# Altium footprint library IC.PcbLib: 386 footprints (part 8 of 30)
Each footprint in its own frame and in the unit in brackets; x right, y up, seen from the top. Pads: shape width x height; smd on the part's side, far side on the other; paste and mask are expansions set on the pad; w line width, h text height; cw(c..) or ccw(c..) is an arc to the next point about the centre after c.
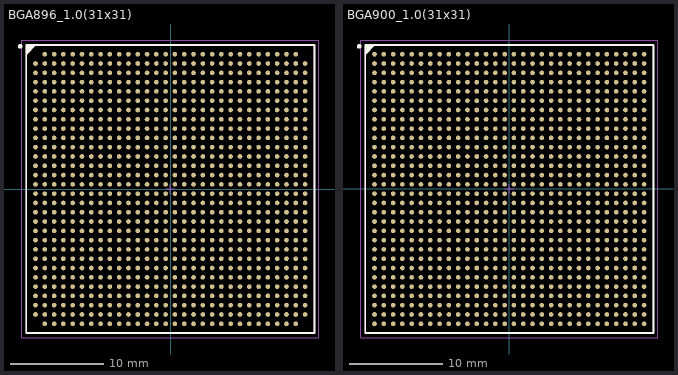
[diagram p7: the footprints below, top view; thin cyan lines are the x and y axes]

## BGA896_1.0(31x31) [mm]
height 0.65
pads (896):
  round 0.5 smd: A2(-13.525,14.525) A3(-12.525,14.525) A4(-11.525,14.525) A5(-10.525,14.525) A6(-9.525,14.525) A7(-8.525,14.525) A8(-7.525,14.525) A9(-6.525,14.525) A10(-5.525,14.525) A11(-4.525,14.525) A12(-3.525,14.525) A13(-2.525,14.525) A14(-1.525,14.525) A15(-0.525,14.525) A16(0.475,14.525) A17(1.475,14.525) A18(2.475,14.525) A19(3.475,14.525) A20(4.475,14.525) A21(5.475,14.525) A22(6.475,14.525) A23(7.475,14.525) A24(8.475,14.525) A25(9.475,14.525) A26(10.475,14.525) A27(11.475,14.525) A28(12.475,14.525) A29(13.475,14.525) AA1(-14.525,-5.475) AA2(-13.525,-5.475) AA3(-12.525,-5.475) AA4(-11.525,-5.475) AA5(-10.525,-5.475) AA6(-9.525,-5.475) AA7(-8.525,-5.475) AA8(-7.525,-5.475) AA9(-6.525,-5.475) AA10(-5.525,-5.475) AA11(-4.525,-5.475) AA12(-3.525,-5.475) AA13(-2.525,-5.475) AA14(-1.525,-5.475) AA15(-0.525,-5.475) AA16(0.475,-5.475) AA17(1.475,-5.475) AA18(2.475,-5.475) AA19(3.475,-5.475) AA20(4.475,-5.475) AA21(5.475,-5.475) AA22(6.475,-5.475) AA23(7.475,-5.475) AA24(8.475,-5.475) AA25(9.475,-5.475) AA26(10.475,-5.475) AA27(11.475,-5.475) AA28(12.475,-5.475) AA29(13.475,-5.475) AA30(14.475,-5.475) AB1(-14.525,-6.475) AB2(-13.525,-6.475) AB3(-12.525,-6.475) AB4(-11.525,-6.475) AB5(-10.525,-6.475) AB6(-9.525,-6.475) AB7(-8.525,-6.475) AB8(-7.525,-6.475) AB9(-6.525,-6.475) AB10(-5.525,-6.475) AB11(-4.525,-6.475) AB12(-3.525,-6.475) AB13(-2.525,-6.475) AB14(-1.525,-6.475) AB15(-0.525,-6.475) AB16(0.475,-6.475) AB17(1.475,-6.475) AB18(2.475,-6.475) AB19(3.475,-6.475) AB20(4.475,-6.475) AB21(5.475,-6.475) AB22(6.475,-6.475) AB23(7.475,-6.475) AB24(8.475,-6.475) AB25(9.475,-6.475) AB26(10.475,-6.475) AB27(11.475,-6.475) AB28(12.475,-6.475) AB29(13.475,-6.475) AB30(14.475,-6.475) AC1(-14.525,-7.475) AC2(-13.525,-7.475) AC3(-12.525,-7.475) AC4(-11.525,-7.475) AC5(-10.525,-7.475) AC6(-9.525,-7.475) AC7(-8.525,-7.475) AC8(-7.525,-7.475) AC9(-6.525,-7.475) AC10(-5.525,-7.475) AC11(-4.525,-7.475) AC12(-3.525,-7.475) AC13(-2.525,-7.475) AC14(-1.525,-7.475) AC15(-0.525,-7.475) AC16(0.475,-7.475) AC17(1.475,-7.475) AC18(2.475,-7.475) AC19(3.475,-7.475) AC20(4.475,-7.475) AC21(5.475,-7.475) AC22(6.475,-7.475) AC23(7.475,-7.475) AC24(8.475,-7.475) AC25(9.475,-7.475) AC26(10.475,-7.475) AC27(11.475,-7.475) AC28(12.475,-7.475) AC29(13.475,-7.475) AC30(14.475,-7.475) AD1(-14.525,-8.475) AD2(-13.525,-8.475) AD3(-12.525,-8.475) AD4(-11.525,-8.475) AD5(-10.525,-8.475) AD6(-9.525,-8.475) AD7(-8.525,-8.475) AD8(-7.525,-8.475) AD9(-6.525,-8.475) AD10(-5.525,-8.475) AD11(-4.525,-8.475) AD12(-3.525,-8.475) AD13(-2.525,-8.475) AD14(-1.525,-8.475) AD15(-0.525,-8.475) AD16(0.475,-8.475) AD17(1.475,-8.475) AD18(2.475,-8.475) AD19(3.475,-8.475) AD20(4.475,-8.475) AD21(5.475,-8.475) AD22(6.475,-8.475) AD23(7.475,-8.475) AD24(8.475,-8.475) AD25(9.475,-8.475) AD26(10.475,-8.475) AD27(11.475,-8.475) AD28(12.475,-8.475) AD29(13.475,-8.475) AD30(14.475,-8.475) AE1(-14.525,-9.475) AE2(-13.525,-9.475) AE3(-12.525,-9.475) AE4(-11.525,-9.475) AE5(-10.525,-9.475) AE6(-9.525,-9.475) AE7(-8.525,-9.475) AE8(-7.525,-9.475) AE9(-6.525,-9.475) AE10(-5.525,-9.475) AE11(-4.525,-9.475) AE12(-3.525,-9.475) AE13(-2.525,-9.475) AE14(-1.525,-9.475) AE15(-0.525,-9.475) AE16(0.475,-9.475) AE17(1.475,-9.475) AE18(2.475,-9.475) AE19(3.475,-9.475) AE20(4.475,-9.475) AE21(5.475,-9.475) AE22(6.475,-9.475) AE23(7.475,-9.475) AE24(8.475,-9.475) AE25(9.475,-9.475) AE26(10.475,-9.475) AE27(11.475,-9.475) AE28(12.475,-9.475) AE29(13.475,-9.475) AE30(14.475,-9.475) AF1(-14.525,-10.475) AF2(-13.525,-10.475) AF3(-12.525,-10.475) AF4(-11.525,-10.475) AF5(-10.525,-10.475) AF6(-9.525,-10.475) AF7(-8.525,-10.475) AF8(-7.525,-10.475) AF9(-6.525,-10.475) AF10(-5.525,-10.475) AF11(-4.525,-10.475) AF12(-3.525,-10.475) AF13(-2.525,-10.475) AF14(-1.525,-10.475) AF15(-0.525,-10.475) AF16(0.475,-10.475) AF17(1.475,-10.475) AF18(2.475,-10.475) AF19(3.475,-10.475) AF20(4.475,-10.475) AF21(5.475,-10.475) AF22(6.475,-10.475) AF23(7.475,-10.475) AF24(8.475,-10.475) AF25(9.475,-10.475) AF26(10.475,-10.475) AF27(11.475,-10.475) AF28(12.475,-10.475) AF29(13.475,-10.475) AF30(14.475,-10.475) AG1(-14.525,-11.475) AG2(-13.525,-11.475) AG3(-12.525,-11.475) AG4(-11.525,-11.475) AG5(-10.525,-11.475) AG6(-9.525,-11.475) AG7(-8.525,-11.475) AG8(-7.525,-11.475) AG9(-6.525,-11.475) AG10(-5.525,-11.475) AG11(-4.525,-11.475) AG12(-3.525,-11.475) AG13(-2.525,-11.475) AG14(-1.525,-11.475) AG15(-0.525,-11.475) AG16(0.475,-11.475) AG17(1.475,-11.475) AG18(2.475,-11.475) AG19(3.475,-11.475) AG20(4.475,-11.475) AG21(5.475,-11.475) AG22(6.475,-11.475) AG23(7.475,-11.475) AG24(8.475,-11.475) AG25(9.475,-11.475) AG26(10.475,-11.475) AG27(11.475,-11.475) AG28(12.475,-11.475) AG29(13.475,-11.475) AG30(14.475,-11.475) AH1(-14.525,-12.475) AH2(-13.525,-12.475) AH3(-12.525,-12.475) AH4(-11.525,-12.475) AH5(-10.525,-12.475) AH6(-9.525,-12.475) AH7(-8.525,-12.475) AH8(-7.525,-12.475) AH9(-6.525,-12.475) AH10(-5.525,-12.475) AH11(-4.525,-12.475) AH12(-3.525,-12.475) AH13(-2.525,-12.475) AH14(-1.525,-12.475) AH15(-0.525,-12.475) AH16(0.475,-12.475) AH17(1.475,-12.475) AH18(2.475,-12.475) AH19(3.475,-12.475) AH20(4.475,-12.475) AH21(5.475,-12.475) AH22(6.475,-12.475) AH23(7.475,-12.475) AH24(8.475,-12.475) AH25(9.475,-12.475) AH26(10.475,-12.475) AH27(11.475,-12.475) AH28(12.475,-12.475) AH29(13.475,-12.475) AH30(14.475,-12.475) AJ1(-14.525,-13.475) AJ2(-13.525,-13.475) AJ3(-12.525,-13.475) AJ4(-11.525,-13.475) AJ5(-10.525,-13.475) AJ6(-9.525,-13.475) AJ7(-8.525,-13.475) AJ8(-7.525,-13.475) AJ9(-6.525,-13.475) AJ10(-5.525,-13.475) AJ11(-4.525,-13.475) AJ12(-3.525,-13.475) AJ13(-2.525,-13.475) AJ14(-1.525,-13.475) AJ15(-0.525,-13.475) AJ16(0.475,-13.475) AJ17(1.475,-13.475) AJ18(2.475,-13.475) AJ19(3.475,-13.475) AJ20(4.475,-13.475) AJ21(5.475,-13.475) AJ22(6.475,-13.475) AJ23(7.475,-13.475) AJ24(8.475,-13.475) AJ25(9.475,-13.475) AJ26(10.475,-13.475) AJ27(11.475,-13.475) AJ28(12.475,-13.475) AJ29(13.475,-13.475) AJ30(14.475,-13.475) AK2(-13.525,-14.475) AK3(-12.525,-14.475) AK4(-11.525,-14.475) AK5(-10.525,-14.475) AK6(-9.525,-14.475) AK7(-8.525,-14.475) AK8(-7.525,-14.475) AK9(-6.525,-14.475) AK10(-5.525,-14.475) AK11(-4.525,-14.475) AK12(-3.525,-14.475) AK13(-2.525,-14.475) AK14(-1.525,-14.475) AK15(-0.525,-14.475) AK16(0.475,-14.475) AK17(1.475,-14.475) AK18(2.475,-14.475) AK19(3.475,-14.475) AK20(4.475,-14.475) AK21(5.475,-14.475) AK22(6.475,-14.475) AK23(7.475,-14.475) AK24(8.475,-14.475) AK25(9.475,-14.475) AK26(10.475,-14.475) AK27(11.475,-14.475) AK28(12.475,-14.475) AK29(13.475,-14.475) B1(-14.525,13.525) B2(-13.525,13.525) B3(-12.525,13.525) B4(-11.525,13.525) B5(-10.525,13.525) B6(-9.525,13.525) B7(-8.525,13.525) B8(-7.525,13.525) B9(-6.525,13.525) B10(-5.525,13.525) B11(-4.525,13.525) B12(-3.525,13.525) B13(-2.525,13.525) B14(-1.525,13.525) B15(-0.525,13.525) B16(0.475,13.525) B17(1.475,13.525) B18(2.475,13.525) B19(3.475,13.525) B20(4.475,13.525) B21(5.475,13.525) B22(6.475,13.525) B23(7.475,13.525) B24(8.475,13.525) B25(9.475,13.525) B26(10.475,13.525) B27(11.475,13.525) B28(12.475,13.525) B29(13.475,13.525) B30(14.475,13.525) C1(-14.525,12.525) C2(-13.525,12.525) C3(-12.525,12.525) C4(-11.525,12.525) C5(-10.525,12.525) C6(-9.525,12.525) C7(-8.525,12.525) C8(-7.525,12.525) C9(-6.525,12.525) C10(-5.525,12.525) C11(-4.525,12.525) C12(-3.525,12.525) C13(-2.525,12.525) C14(-1.525,12.525) C15(-0.525,12.525) C16(0.475,12.525) C17(1.475,12.525) C18(2.475,12.525) C19(3.475,12.525) C20(4.475,12.525) C21(5.475,12.525) C22(6.475,12.525) C23(7.475,12.525) C24(8.475,12.525) C25(9.475,12.525) C26(10.475,12.525) C27(11.475,12.525) C28(12.475,12.525) C29(13.475,12.525) C30(14.475,12.525) D1(-14.525,11.525) D2(-13.525,11.525) D3(-12.525,11.525) D4(-11.525,11.525) D5(-10.525,11.525) D6(-9.525,11.525) D7(-8.525,11.525) D8(-7.525,11.525) D9(-6.525,11.525) D10(-5.525,11.525) D11(-4.525,11.525) D12(-3.525,11.525) D13(-2.525,11.525) D14(-1.525,11.525) D15(-0.525,11.525) D16(0.475,11.525) D17(1.475,11.525) D18(2.475,11.525) D19(3.475,11.525) D20(4.475,11.525) D21(5.475,11.525) D22(6.475,11.525) D23(7.475,11.525) D24(8.475,11.525) D25(9.475,11.525) D26(10.475,11.525) D27(11.475,11.525) D28(12.475,11.525) D29(13.475,11.525) D30(14.475,11.525) E1(-14.525,10.525) E2(-13.525,10.525) E3(-12.525,10.525) E4(-11.525,10.525) E5(-10.525,10.525) E6(-9.525,10.525) E7(-8.525,10.525) E8(-7.525,10.525) E9(-6.525,10.525) E10(-5.525,10.525) E11(-4.525,10.525) E12(-3.525,10.525) E13(-2.525,10.525) E14(-1.525,10.525) E15(-0.525,10.525) E16(0.475,10.525) E17(1.475,10.525) E18(2.475,10.525) E19(3.475,10.525) E20(4.475,10.525) E21(5.475,10.525) E22(6.475,10.525) E23(7.475,10.525) E24(8.475,10.525) E25(9.475,10.525) E26(10.475,10.525) E27(11.475,10.525) E28(12.475,10.525) E29(13.475,10.525) E30(14.475,10.525) F1(-14.525,9.525) F2(-13.525,9.525) F3(-12.525,9.525) F4(-11.525,9.525) F5(-10.525,9.525) F6(-9.525,9.525) F7(-8.525,9.525) F8(-7.525,9.525) F9(-6.525,9.525) F10(-5.525,9.525) F11(-4.525,9.525) F12(-3.525,9.525) F13(-2.525,9.525) F14(-1.525,9.525) F15(-0.525,9.525) F16(0.475,9.525) F17(1.475,9.525) F18(2.475,9.525) F19(3.475,9.525) F20(4.475,9.525) F21(5.475,9.525) F22(6.475,9.525) F23(7.475,9.525) F24(8.475,9.525) F25(9.475,9.525) F26(10.475,9.525) F27(11.475,9.525) F28(12.475,9.525) F29(13.475,9.525) F30(14.475,9.525) G1(-14.525,8.525) G2(-13.525,8.525) G3(-12.525,8.525) G4(-11.525,8.525) G5(-10.525,8.525) G6(-9.525,8.525) G7(-8.525,8.525) G8(-7.525,8.525) G9(-6.525,8.525) G10(-5.525,8.525) G11(-4.525,8.525) G12(-3.525,8.525) G13(-2.525,8.525) G14(-1.525,8.525) G15(-0.525,8.525) G16(0.475,8.525) G17(1.475,8.525) G18(2.475,8.525) G19(3.475,8.525) G20(4.475,8.525) G21(5.475,8.525) G22(6.475,8.525) G23(7.475,8.525) G24(8.475,8.525) G25(9.475,8.525) G26(10.475,8.525) G27(11.475,8.525) G28(12.475,8.525) G29(13.475,8.525) G30(14.475,8.525) H1(-14.525,7.525) H2(-13.525,7.525) H3(-12.525,7.525) H4(-11.525,7.525) H5(-10.525,7.525) H6(-9.525,7.525) H7(-8.525,7.525) H8(-7.525,7.525) H9(-6.525,7.525) H10(-5.525,7.525) H11(-4.525,7.525) H12(-3.525,7.525) H13(-2.525,7.525) H14(-1.525,7.525) H15(-0.525,7.525) H16(0.475,7.525) H17(1.475,7.525) H18(2.475,7.525) H19(3.475,7.525) H20(4.475,7.525) H21(5.475,7.525) H22(6.475,7.525) H23(7.475,7.525) H24(8.475,7.525) H25(9.475,7.525) H26(10.475,7.525) H27(11.475,7.525) H28(12.475,7.525) H29(13.475,7.525) H30(14.475,7.525) J1(-14.525,6.525) J2(-13.525,6.525) J3(-12.525,6.525) J4(-11.525,6.525) J5(-10.525,6.525) J6(-9.525,6.525) J7(-8.525,6.525) J8(-7.525,6.525) J9(-6.525,6.525) J10(-5.525,6.525) J11(-4.525,6.525) J12(-3.525,6.525) J13(-2.525,6.525) J14(-1.525,6.525) J15(-0.525,6.525) J16(0.475,6.525) J17(1.475,6.525) J18(2.475,6.525) J19(3.475,6.525) J20(4.475,6.525) J21(5.475,6.525) J22(6.475,6.525) J23(7.475,6.525) J24(8.475,6.525) J25(9.475,6.525) J26(10.475,6.525) J27(11.475,6.525) J28(12.475,6.525) J29(13.475,6.525) J30(14.475,6.525) K1(-14.525,5.525) K2(-13.525,5.525) K3(-12.525,5.525) K4(-11.525,5.525) K5(-10.525,5.525) K6(-9.525,5.525) K7(-8.525,5.525) K8(-7.525,5.525) K9(-6.525,5.525) K10(-5.525,5.525) K11(-4.525,5.525) K12(-3.525,5.525) K13(-2.525,5.525) K14(-1.525,5.525) K15(-0.525,5.525) K16(0.475,5.525) K17(1.475,5.525) K18(2.475,5.525) K19(3.475,5.525) K20(4.475,5.525) K21(5.475,5.525) K22(6.475,5.525) K23(7.475,5.525) K24(8.475,5.525) K25(9.475,5.525) K26(10.475,5.525) K27(11.475,5.525) K28(12.475,5.525) K29(13.475,5.525) K30(14.475,5.525) L1(-14.525,4.525) L2(-13.525,4.525) L3(-12.525,4.525) L4(-11.525,4.525) L5(-10.525,4.525) L6(-9.525,4.525) L7(-8.525,4.525) L8(-7.525,4.525) L9(-6.525,4.525) L10(-5.525,4.525) L11(-4.525,4.525) L12(-3.525,4.525) L13(-2.525,4.525) L14(-1.525,4.525) L15(-0.525,4.525) L16(0.475,4.525) L17(1.475,4.525) L18(2.475,4.525) L19(3.475,4.525) L20(4.475,4.525) L21(5.475,4.525) L22(6.475,4.525) L23(7.475,4.525) L24(8.475,4.525) L25(9.475,4.525) L26(10.475,4.525) L27(11.475,4.525) L28(12.475,4.525) L29(13.475,4.525) L30(14.475,4.525) M1(-14.525,3.525) M2(-13.525,3.525) M3(-12.525,3.525) M4(-11.525,3.525) M5(-10.525,3.525) M6(-9.525,3.525) M7(-8.525,3.525) M8(-7.525,3.525) M9(-6.525,3.525) M10(-5.525,3.525) M11(-4.525,3.525) M12(-3.525,3.525) M13(-2.525,3.525) M14(-1.525,3.525) M15(-0.525,3.525) M16(0.475,3.525) M17(1.475,3.525) M18(2.475,3.525) M19(3.475,3.525) M20(4.475,3.525) M21(5.475,3.525) M22(6.475,3.525) M23(7.475,3.525) M24(8.475,3.525) M25(9.475,3.525) M26(10.475,3.525) M27(11.475,3.525) M28(12.475,3.525) M29(13.475,3.525) M30(14.475,3.525) N1(-14.525,2.525) N2(-13.525,2.525) N3(-12.525,2.525) N4(-11.525,2.525) N5(-10.525,2.525) N6(-9.525,2.525) N7(-8.525,2.525) N8(-7.525,2.525) N9(-6.525,2.525) N10(-5.525,2.525) N11(-4.525,2.525) N12(-3.525,2.525) N13(-2.525,2.525) N14(-1.525,2.525) N15(-0.525,2.525) N16(0.475,2.525) N17(1.475,2.525) N18(2.475,2.525) N19(3.475,2.525) N20(4.475,2.525) N21(5.475,2.525) N22(6.475,2.525) N23(7.475,2.525) N24(8.475,2.525) N25(9.475,2.525) N26(10.475,2.525) N27(11.475,2.525) N28(12.475,2.525) N29(13.475,2.525) N30(14.475,2.525) P1(-14.525,1.525) P2(-13.525,1.525) P3(-12.525,1.525) P4(-11.525,1.525) P5(-10.525,1.525) P6(-9.525,1.525) P7(-8.525,1.525) P8(-7.525,1.525) P9(-6.525,1.525) P10(-5.525,1.525) P11(-4.525,1.525) P12(-3.525,1.525) P13(-2.525,1.525) P14(-1.525,1.525) P15(-0.525,1.525) P16(0.475,1.525) P17(1.475,1.525) P18(2.475,1.525) P19(3.475,1.525) P20(4.475,1.525) P21(5.475,1.525) P22(6.475,1.525) P23(7.475,1.525) P24(8.475,1.525) P25(9.475,1.525) P26(10.475,1.525) P27(11.475,1.525) P28(12.475,1.525) P29(13.475,1.525) P30(14.475,1.525) R1(-14.525,0.525) R2(-13.525,0.525) R3(-12.525,0.525) R4(-11.525,0.525) R5(-10.525,0.525) R6(-9.525,0.525) R7(-8.525,0.525) R8(-7.525,0.525) R9(-6.525,0.525) R10(-5.525,0.525) R11(-4.525,0.525) R12(-3.525,0.525) R13(-2.525,0.525) R14(-1.525,0.525) R15(-0.525,0.525) R16(0.475,0.525) R17(1.475,0.525) R18(2.475,0.525) R19(3.475,0.525) R20(4.475,0.525) R21(5.475,0.525) R22(6.475,0.525) R23(7.475,0.525) R24(8.475,0.525) R25(9.475,0.525) R26(10.475,0.525) R27(11.475,0.525) R28(12.475,0.525) R29(13.475,0.525) R30(14.475,0.525) T1(-14.525,-0.475) T2(-13.525,-0.475) T3(-12.525,-0.475) T4(-11.525,-0.475) T5(-10.525,-0.475) T6(-9.525,-0.475) T7(-8.525,-0.475) T8(-7.525,-0.475) T9(-6.525,-0.475) T10(-5.525,-0.475) T11(-4.525,-0.475) T12(-3.525,-0.475) T13(-2.525,-0.475) T14(-1.525,-0.475) T15(-0.525,-0.475) T16(0.475,-0.475) T17(1.475,-0.475) T18(2.475,-0.475) T19(3.475,-0.475) T20(4.475,-0.475) T21(5.475,-0.475) T22(6.475,-0.475) T23(7.475,-0.475) T24(8.475,-0.475) T25(9.475,-0.475) T26(10.475,-0.475) T27(11.475,-0.475) T28(12.475,-0.475) T29(13.475,-0.475) T30(14.475,-0.475) U1(-14.525,-1.475) U2(-13.525,-1.475) U3(-12.525,-1.475) U4(-11.525,-1.475) U5(-10.525,-1.475) U6(-9.525,-1.475) U7(-8.525,-1.475) U8(-7.525,-1.475) U9(-6.525,-1.475) U10(-5.525,-1.475) U11(-4.525,-1.475) U12(-3.525,-1.475) U13(-2.525,-1.475) U14(-1.525,-1.475) U15(-0.525,-1.475) U16(0.475,-1.475) U17(1.475,-1.475) U18(2.475,-1.475) U19(3.475,-1.475) U20(4.475,-1.475) U21(5.475,-1.475) U22(6.475,-1.475) U23(7.475,-1.475) U24(8.475,-1.475) U25(9.475,-1.475) U26(10.475,-1.475) U27(11.475,-1.475) U28(12.475,-1.475) U29(13.475,-1.475) U30(14.475,-1.475) V1(-14.525,-2.475) V2(-13.525,-2.475) V3(-12.525,-2.475) V4(-11.525,-2.475) V5(-10.525,-2.475) V6(-9.525,-2.475) V7(-8.525,-2.475) V8(-7.525,-2.475) V9(-6.525,-2.475) V10(-5.525,-2.475) V11(-4.525,-2.475) V12(-3.525,-2.475) V13(-2.525,-2.475) V14(-1.525,-2.475) V15(-0.525,-2.475) V16(0.475,-2.475) V17(1.475,-2.475) V18(2.475,-2.475) V19(3.475,-2.475) V20(4.475,-2.475) V21(5.475,-2.475) V22(6.475,-2.475) V23(7.475,-2.475) V24(8.475,-2.475) V25(9.475,-2.475) V26(10.475,-2.475) V27(11.475,-2.475) V28(12.475,-2.475) V29(13.475,-2.475) V30(14.475,-2.475) W1(-14.525,-3.475) W2(-13.525,-3.475) W3(-12.525,-3.475) W4(-11.525,-3.475) W5(-10.525,-3.475) W6(-9.525,-3.475) W7(-8.525,-3.475) W8(-7.525,-3.475) W9(-6.525,-3.475) W10(-5.525,-3.475) W11(-4.525,-3.475) W12(-3.525,-3.475) W13(-2.525,-3.475) W14(-1.525,-3.475) W15(-0.525,-3.475) W16(0.475,-3.475) W17(1.475,-3.475) W18(2.475,-3.475) W19(3.475,-3.475) W20(4.475,-3.475) W21(5.475,-3.475) W22(6.475,-3.475) W23(7.475,-3.475) W24(8.475,-3.475) W25(9.475,-3.475) W26(10.475,-3.475) W27(11.475,-3.475) W28(12.475,-3.475) W29(13.475,-3.475) W30(14.475,-3.475) Y1(-14.525,-4.475) Y2(-13.525,-4.475) Y3(-12.525,-4.475) Y4(-11.525,-4.475) Y5(-10.525,-4.475) Y6(-9.525,-4.475) Y7(-8.525,-4.475) Y8(-7.525,-4.475) Y9(-6.525,-4.475) Y10(-5.525,-4.475) Y11(-4.525,-4.475) Y12(-3.525,-4.475) Y13(-2.525,-4.475) Y14(-1.525,-4.475) Y15(-0.525,-4.475) Y16(0.475,-4.475) Y17(1.475,-4.475) Y18(2.475,-4.475) Y19(3.475,-4.475) Y20(4.475,-4.475) Y21(5.475,-4.475) Y22(6.475,-4.475) Y23(7.475,-4.475) Y24(8.475,-4.475) Y25(9.475,-4.475) Y26(10.475,-4.475) Y27(11.475,-4.475) Y28(12.475,-4.475) Y29(13.475,-4.475) Y30(14.475,-4.475)
Top Overlay:
  circle w0.25: c-16.175,15.375 r0.125
  region: -14.525,15.525 -15.525,14.525 -15.525,15.525
  lines w0.2: -15.525,14.525 -14.525,15.525 ; -15.525,-15.475 15.475,-15.475 15.475,15.525 -15.525,15.525 -15.525,-15.475
Mechanical 13:
  lines w0.1: -15.525,-15.475 15.475,-15.475 15.475,15.525 -15.525,15.525 -15.525,-15.475
Mechanical 15:
  lines w0.05: -16.025,-15.975 15.975,-15.975 15.975,16.025 -16.025,16.025 -16.025,-15.975
  lines w0.1: -0.525,0.025 0.475,0.025 ; -0.025,-0.475 -0.025,0.525
3D body "User Library-FBGA 896.step": height 1.75, standoff 0, extent -15.525,-15.449 15.475,15.551

## BGA900_1.0(31x31) [mm]
height 0.65
pads (900):
  round 0.5 smd: A1(-14.5,14.475) A2(-13.5,14.475) A3(-12.5,14.475) A4(-11.5,14.475) A5(-10.5,14.475) A6(-9.5,14.475) A7(-8.5,14.475) A8(-7.5,14.475) A9(-6.5,14.475) A10(-5.5,14.475) A11(-4.5,14.475) A12(-3.5,14.475) A13(-2.5,14.475) A14(-1.5,14.475) A15(-0.5,14.475) A16(0.5,14.475) A17(1.5,14.475) A18(2.5,14.475) A19(3.5,14.475) A20(4.5,14.475) A21(5.5,14.475) A22(6.5,14.475) A23(7.5,14.475) A24(8.5,14.475) A25(9.5,14.475) A26(10.5,14.475) A27(11.5,14.475) A28(12.5,14.475) A29(13.5,14.475) A30(14.5,14.475) AA1(-14.5,-5.525) AA2(-13.5,-5.525) AA3(-12.5,-5.525) AA4(-11.5,-5.525) AA5(-10.5,-5.525) AA6(-9.5,-5.525) AA7(-8.5,-5.525) AA8(-7.5,-5.525) AA9(-6.5,-5.525) AA10(-5.5,-5.525) AA11(-4.5,-5.525) AA12(-3.5,-5.525) AA13(-2.5,-5.525) AA14(-1.5,-5.525) AA15(-0.5,-5.525) AA16(0.5,-5.525) AA17(1.5,-5.525) AA18(2.5,-5.525) AA19(3.5,-5.525) AA20(4.5,-5.525) AA21(5.5,-5.525) AA22(6.5,-5.525) AA23(7.5,-5.525) AA24(8.5,-5.525) AA25(9.5,-5.525) AA26(10.5,-5.525) AA27(11.5,-5.525) AA28(12.5,-5.525) AA29(13.5,-5.525) AA30(14.5,-5.525) AB1(-14.5,-6.525) AB2(-13.5,-6.525) AB3(-12.5,-6.525) AB4(-11.5,-6.525) AB5(-10.5,-6.525) AB6(-9.5,-6.525) AB7(-8.5,-6.525) AB8(-7.5,-6.525) AB9(-6.5,-6.525) AB10(-5.5,-6.525) AB11(-4.5,-6.525) AB12(-3.5,-6.525) AB13(-2.5,-6.525) AB14(-1.5,-6.525) AB15(-0.5,-6.525) AB16(0.5,-6.525) AB17(1.5,-6.525) AB18(2.5,-6.525) AB19(3.5,-6.525) AB20(4.5,-6.525) AB21(5.5,-6.525) AB22(6.5,-6.525) AB23(7.5,-6.525) AB24(8.5,-6.525) AB25(9.5,-6.525) AB26(10.5,-6.525) AB27(11.5,-6.525) AB28(12.5,-6.525) AB29(13.5,-6.525) AB30(14.5,-6.525) AC1(-14.5,-7.525) AC2(-13.5,-7.525) AC3(-12.5,-7.525) AC4(-11.5,-7.525) AC5(-10.5,-7.525) AC6(-9.5,-7.525) AC7(-8.5,-7.525) AC8(-7.5,-7.525) AC9(-6.5,-7.525) AC10(-5.5,-7.525) AC11(-4.5,-7.525) AC12(-3.5,-7.525) AC13(-2.5,-7.525) AC14(-1.5,-7.525) AC15(-0.5,-7.525) AC16(0.5,-7.525) AC17(1.5,-7.525) AC18(2.5,-7.525) AC19(3.5,-7.525) AC20(4.5,-7.525) AC21(5.5,-7.525) AC22(6.5,-7.525) AC23(7.5,-7.525) AC24(8.5,-7.525) AC25(9.5,-7.525) AC26(10.5,-7.525) AC27(11.5,-7.525) AC28(12.5,-7.525) AC29(13.5,-7.525) AC30(14.5,-7.525) AD1(-14.5,-8.525) AD2(-13.5,-8.525) AD3(-12.5,-8.525) AD4(-11.5,-8.525) AD5(-10.5,-8.525) AD6(-9.5,-8.525) AD7(-8.5,-8.525) AD8(-7.5,-8.525) AD9(-6.5,-8.525) AD10(-5.5,-8.525) AD11(-4.5,-8.525) AD12(-3.5,-8.525) AD13(-2.5,-8.525) AD14(-1.5,-8.525) AD15(-0.5,-8.525) AD16(0.5,-8.525) AD17(1.5,-8.525) AD18(2.5,-8.525) AD19(3.5,-8.525) AD20(4.5,-8.525) AD21(5.5,-8.525) AD22(6.5,-8.525) AD23(7.5,-8.525) AD24(8.5,-8.525) AD25(9.5,-8.525) AD26(10.5,-8.525) AD27(11.5,-8.525) AD28(12.5,-8.525) AD29(13.5,-8.525) AD30(14.5,-8.525) AE1(-14.5,-9.525) AE2(-13.5,-9.525) AE3(-12.5,-9.525) AE4(-11.5,-9.525) AE5(-10.5,-9.525) AE6(-9.5,-9.525) AE7(-8.5,-9.525) AE8(-7.5,-9.525) AE9(-6.5,-9.525) AE10(-5.5,-9.525) AE11(-4.5,-9.525) AE12(-3.5,-9.525) AE13(-2.5,-9.525) AE14(-1.5,-9.525) AE15(-0.5,-9.525) AE16(0.5,-9.525) AE17(1.5,-9.525) AE18(2.5,-9.525) AE19(3.5,-9.525) AE20(4.5,-9.525) AE21(5.5,-9.525) AE22(6.5,-9.525) AE23(7.5,-9.525) AE24(8.5,-9.525) AE25(9.5,-9.525) AE26(10.5,-9.525) AE27(11.5,-9.525) AE28(12.5,-9.525) AE29(13.5,-9.525) AE30(14.5,-9.525) AF1(-14.5,-10.525) AF2(-13.5,-10.525) AF3(-12.5,-10.525) AF4(-11.5,-10.525) AF5(-10.5,-10.525) AF6(-9.5,-10.525) AF7(-8.5,-10.525) AF8(-7.5,-10.525) AF9(-6.5,-10.525) AF10(-5.5,-10.525) AF11(-4.5,-10.525) AF12(-3.5,-10.525) AF13(-2.5,-10.525) AF14(-1.5,-10.525) AF15(-0.5,-10.525) AF16(0.5,-10.525) AF17(1.5,-10.525) AF18(2.5,-10.525) AF19(3.5,-10.525) AF20(4.5,-10.525) AF21(5.5,-10.525) AF22(6.5,-10.525) AF23(7.5,-10.525) AF24(8.5,-10.525) AF25(9.5,-10.525) AF26(10.5,-10.525) AF27(11.5,-10.525) AF28(12.5,-10.525) AF29(13.5,-10.525) AF30(14.5,-10.525) AG1(-14.5,-11.525) AG2(-13.5,-11.525) AG3(-12.5,-11.525) AG4(-11.5,-11.525) AG5(-10.5,-11.525) AG6(-9.5,-11.525) AG7(-8.5,-11.525) AG8(-7.5,-11.525) AG9(-6.5,-11.525) AG10(-5.5,-11.525) AG11(-4.5,-11.525) AG12(-3.5,-11.525) AG13(-2.5,-11.525) AG14(-1.5,-11.525) AG15(-0.5,-11.525) AG16(0.5,-11.525) AG17(1.5,-11.525) AG18(2.5,-11.525) AG19(3.5,-11.525) AG20(4.5,-11.525) AG21(5.5,-11.525) AG22(6.5,-11.525) AG23(7.5,-11.525) AG24(8.5,-11.525) AG25(9.5,-11.525) AG26(10.5,-11.525) AG27(11.5,-11.525) AG28(12.5,-11.525) AG29(13.5,-11.525) AG30(14.5,-11.525) AH1(-14.5,-12.525) AH2(-13.5,-12.525) AH3(-12.5,-12.525) AH4(-11.5,-12.525) AH5(-10.5,-12.525) AH6(-9.5,-12.525) AH7(-8.5,-12.525) AH8(-7.5,-12.525) AH9(-6.5,-12.525) AH10(-5.5,-12.525) AH11(-4.5,-12.525) AH12(-3.5,-12.525) AH13(-2.5,-12.525) AH14(-1.5,-12.525) AH15(-0.5,-12.525) AH16(0.5,-12.525) AH17(1.5,-12.525) AH18(2.5,-12.525) AH19(3.5,-12.525) AH20(4.5,-12.525) AH21(5.5,-12.525) AH22(6.5,-12.525) AH23(7.5,-12.525) AH24(8.5,-12.525) AH25(9.5,-12.525) AH26(10.5,-12.525) AH27(11.5,-12.525) AH28(12.5,-12.525) AH29(13.5,-12.525) AH30(14.5,-12.525) AJ1(-14.5,-13.525) AJ2(-13.5,-13.525) AJ3(-12.5,-13.525) AJ4(-11.5,-13.525) AJ5(-10.5,-13.525) AJ6(-9.5,-13.525) AJ7(-8.5,-13.525) AJ8(-7.5,-13.525) AJ9(-6.5,-13.525) AJ10(-5.5,-13.525) AJ11(-4.5,-13.525) AJ12(-3.5,-13.525) AJ13(-2.5,-13.525) AJ14(-1.5,-13.525) AJ15(-0.5,-13.525) AJ16(0.5,-13.525) AJ17(1.5,-13.525) AJ18(2.5,-13.525) AJ19(3.5,-13.525) AJ20(4.5,-13.525) AJ21(5.5,-13.525) AJ22(6.5,-13.525) AJ23(7.5,-13.525) AJ24(8.5,-13.525) AJ25(9.5,-13.525) AJ26(10.5,-13.525) AJ27(11.5,-13.525) AJ28(12.5,-13.525) AJ29(13.5,-13.525) AJ30(14.5,-13.525) AK1(-14.5,-14.525) AK2(-13.5,-14.525) AK3(-12.5,-14.525) AK4(-11.5,-14.525) AK5(-10.5,-14.525) AK6(-9.5,-14.525) AK7(-8.5,-14.525) AK8(-7.5,-14.525) AK9(-6.5,-14.525) AK10(-5.5,-14.525) AK11(-4.5,-14.525) AK12(-3.5,-14.525) AK13(-2.5,-14.525) AK14(-1.5,-14.525) AK15(-0.5,-14.525) AK16(0.5,-14.525) AK17(1.5,-14.525) AK18(2.5,-14.525) AK19(3.5,-14.525) AK20(4.5,-14.525) AK21(5.5,-14.525) AK22(6.5,-14.525) AK23(7.5,-14.525) AK24(8.5,-14.525) AK25(9.5,-14.525) AK26(10.5,-14.525) AK27(11.5,-14.525) AK28(12.5,-14.525) AK29(13.5,-14.525) AK30(14.5,-14.525) B1(-14.5,13.475) B2(-13.5,13.475) B3(-12.5,13.475) B4(-11.5,13.475) B5(-10.5,13.475) B6(-9.5,13.475) B7(-8.5,13.475) B8(-7.5,13.475) B9(-6.5,13.475) B10(-5.5,13.475) B11(-4.5,13.475) B12(-3.5,13.475) B13(-2.5,13.475) B14(-1.5,13.475) B15(-0.5,13.475) B16(0.5,13.475) B17(1.5,13.475) B18(2.5,13.475) B19(3.5,13.475) B20(4.5,13.475) B21(5.5,13.475) B22(6.5,13.475) B23(7.5,13.475) B24(8.5,13.475) B25(9.5,13.475) B26(10.5,13.475) B27(11.5,13.475) B28(12.5,13.475) B29(13.5,13.475) B30(14.5,13.475) C1(-14.5,12.475) C2(-13.5,12.475) C3(-12.5,12.475) C4(-11.5,12.475) C5(-10.5,12.475) C6(-9.5,12.475) C7(-8.5,12.475) C8(-7.5,12.475) C9(-6.5,12.475) C10(-5.5,12.475) C11(-4.5,12.475) C12(-3.5,12.475) C13(-2.5,12.475) C14(-1.5,12.475) C15(-0.5,12.475) C16(0.5,12.475) C17(1.5,12.475) C18(2.5,12.475) C19(3.5,12.475) C20(4.5,12.475) C21(5.5,12.475) C22(6.5,12.475) C23(7.5,12.475) C24(8.5,12.475) C25(9.5,12.475) C26(10.5,12.475) C27(11.5,12.475) C28(12.5,12.475) C29(13.5,12.475) C30(14.5,12.475) D1(-14.5,11.475) D2(-13.5,11.475) D3(-12.5,11.475) D4(-11.5,11.475) D5(-10.5,11.475) D6(-9.5,11.475) D7(-8.5,11.475) D8(-7.5,11.475) D9(-6.5,11.475) D10(-5.5,11.475) D11(-4.5,11.475) D12(-3.5,11.475) D13(-2.5,11.475) D14(-1.5,11.475) D15(-0.5,11.475) D16(0.5,11.475) D17(1.5,11.475) D18(2.5,11.475) D19(3.5,11.475) D20(4.5,11.475) D21(5.5,11.475) D22(6.5,11.475) D23(7.5,11.475) D24(8.5,11.475) D25(9.5,11.475) D26(10.5,11.475) D27(11.5,11.475) D28(12.5,11.475) D29(13.5,11.475) D30(14.5,11.475) E1(-14.5,10.475) E2(-13.5,10.475) E3(-12.5,10.475) E4(-11.5,10.475) E5(-10.5,10.475) E6(-9.5,10.475) E7(-8.5,10.475) E8(-7.5,10.475) E9(-6.5,10.475) E10(-5.5,10.475) E11(-4.5,10.475) E12(-3.5,10.475) E13(-2.5,10.475) E14(-1.5,10.475) E15(-0.5,10.475) E16(0.5,10.475) E17(1.5,10.475) E18(2.5,10.475) E19(3.5,10.475) E20(4.5,10.475) E21(5.5,10.475) E22(6.5,10.475) E23(7.5,10.475) E24(8.5,10.475) E25(9.5,10.475) E26(10.5,10.475) E27(11.5,10.475) E28(12.5,10.475) E29(13.5,10.475) E30(14.5,10.475) F1(-14.5,9.475) F2(-13.5,9.475) F3(-12.5,9.475) F4(-11.5,9.475) F5(-10.5,9.475) F6(-9.5,9.475) F7(-8.5,9.475) F8(-7.5,9.475) F9(-6.5,9.475) F10(-5.5,9.475) F11(-4.5,9.475) F12(-3.5,9.475) F13(-2.5,9.475) F14(-1.5,9.475) F15(-0.5,9.475) F16(0.5,9.475) F17(1.5,9.475) F18(2.5,9.475) F19(3.5,9.475) F20(4.5,9.475) F21(5.5,9.475) F22(6.5,9.475) F23(7.5,9.475) F24(8.5,9.475) F25(9.5,9.475) F26(10.5,9.475) F27(11.5,9.475) F28(12.5,9.475) F29(13.5,9.475) F30(14.5,9.475) G1(-14.5,8.475) G2(-13.5,8.475) G3(-12.5,8.475) G4(-11.5,8.475) G5(-10.5,8.475) G6(-9.5,8.475) G7(-8.5,8.475) G8(-7.5,8.475) G9(-6.5,8.475) G10(-5.5,8.475) G11(-4.5,8.475) G12(-3.5,8.475) G13(-2.5,8.475) G14(-1.5,8.475) G15(-0.5,8.475) G16(0.5,8.475) G17(1.5,8.475) G18(2.5,8.475) G19(3.5,8.475) G20(4.5,8.475) G21(5.5,8.475) G22(6.5,8.475) G23(7.5,8.475) G24(8.5,8.475) G25(9.5,8.475) G26(10.5,8.475) G27(11.5,8.475) G28(12.5,8.475) G29(13.5,8.475) G30(14.5,8.475) H1(-14.5,7.475) H2(-13.5,7.475) H3(-12.5,7.475) H4(-11.5,7.475) H5(-10.5,7.475) H6(-9.5,7.475) H7(-8.5,7.475) H8(-7.5,7.475) H9(-6.5,7.475) H10(-5.5,7.475) H11(-4.5,7.475) H12(-3.5,7.475) H13(-2.5,7.475) H14(-1.5,7.475) H15(-0.5,7.475) H16(0.5,7.475) H17(1.5,7.475) H18(2.5,7.475) H19(3.5,7.475) H20(4.5,7.475) H21(5.5,7.475) H22(6.5,7.475) H23(7.5,7.475) H24(8.5,7.475) H25(9.5,7.475) H26(10.5,7.475) H27(11.5,7.475) H28(12.5,7.475) H29(13.5,7.475) H30(14.5,7.475) J1(-14.5,6.475) J2(-13.5,6.475) J3(-12.5,6.475) J4(-11.5,6.475) J5(-10.5,6.475) J6(-9.5,6.475) J7(-8.5,6.475) J8(-7.5,6.475) J9(-6.5,6.475) J10(-5.5,6.475) J11(-4.5,6.475) J12(-3.5,6.475) J13(-2.5,6.475) J14(-1.5,6.475) J15(-0.5,6.475) J16(0.5,6.475) J17(1.5,6.475) J18(2.5,6.475) J19(3.5,6.475) J20(4.5,6.475) J21(5.5,6.475) J22(6.5,6.475) J23(7.5,6.475) J24(8.5,6.475) J25(9.5,6.475) J26(10.5,6.475) J27(11.5,6.475) J28(12.5,6.475) J29(13.5,6.475) J30(14.5,6.475) K1(-14.5,5.475) K2(-13.5,5.475) K3(-12.5,5.475) K4(-11.5,5.475) K5(-10.5,5.475) K6(-9.5,5.475) K7(-8.5,5.475) K8(-7.5,5.475) K9(-6.5,5.475) K10(-5.5,5.475) K11(-4.5,5.475) K12(-3.5,5.475) K13(-2.5,5.475) K14(-1.5,5.475) K15(-0.5,5.475) K16(0.5,5.475) K17(1.5,5.475) K18(2.5,5.475) K19(3.5,5.475) K20(4.5,5.475) K21(5.5,5.475) K22(6.5,5.475) K23(7.5,5.475) K24(8.5,5.475) K25(9.5,5.475) K26(10.5,5.475) K27(11.5,5.475) K28(12.5,5.475) K29(13.5,5.475) K30(14.5,5.475) L1(-14.5,4.475) L2(-13.5,4.475) L3(-12.5,4.475) L4(-11.5,4.475) L5(-10.5,4.475) L6(-9.5,4.475) L7(-8.5,4.475) L8(-7.5,4.475) L9(-6.5,4.475) L10(-5.5,4.475) L11(-4.5,4.475) L12(-3.5,4.475) L13(-2.5,4.475) L14(-1.5,4.475) L15(-0.5,4.475) L16(0.5,4.475) L17(1.5,4.475) L18(2.5,4.475) L19(3.5,4.475) L20(4.5,4.475) L21(5.5,4.475) L22(6.5,4.475) L23(7.5,4.475) L24(8.5,4.475) L25(9.5,4.475) L26(10.5,4.475) L27(11.5,4.475) L28(12.5,4.475) L29(13.5,4.475) L30(14.5,4.475) M1(-14.5,3.475) M2(-13.5,3.475) M3(-12.5,3.475) M4(-11.5,3.475) M5(-10.5,3.475) M6(-9.5,3.475) M7(-8.5,3.475) M8(-7.5,3.475) M9(-6.5,3.475) M10(-5.5,3.475) M11(-4.5,3.475) M12(-3.5,3.475) M13(-2.5,3.475) M14(-1.5,3.475) M15(-0.5,3.475) M16(0.5,3.475) M17(1.5,3.475) M18(2.5,3.475) M19(3.5,3.475) M20(4.5,3.475) M21(5.5,3.475) M22(6.5,3.475) M23(7.5,3.475) M24(8.5,3.475) M25(9.5,3.475) M26(10.5,3.475) M27(11.5,3.475) M28(12.5,3.475) M29(13.5,3.475) M30(14.5,3.475) N1(-14.5,2.475) N2(-13.5,2.475) N3(-12.5,2.475) N4(-11.5,2.475) N5(-10.5,2.475) N6(-9.5,2.475) N7(-8.5,2.475) N8(-7.5,2.475) N9(-6.5,2.475) N10(-5.5,2.475) N11(-4.5,2.475) N12(-3.5,2.475) N13(-2.5,2.475) N14(-1.5,2.475) N15(-0.5,2.475) N16(0.5,2.475) N17(1.5,2.475) N18(2.5,2.475) N19(3.5,2.475) N20(4.5,2.475) N21(5.5,2.475) N22(6.5,2.475) N23(7.5,2.475) N24(8.5,2.475) N25(9.5,2.475) N26(10.5,2.475) N27(11.5,2.475) N28(12.5,2.475) N29(13.5,2.475) N30(14.5,2.475) P1(-14.5,1.475) P2(-13.5,1.475) P3(-12.5,1.475) P4(-11.5,1.475) P5(-10.5,1.475) P6(-9.5,1.475) P7(-8.5,1.475) P8(-7.5,1.475) P9(-6.5,1.475) P10(-5.5,1.475) P11(-4.5,1.475) P12(-3.5,1.475) P13(-2.5,1.475) P14(-1.5,1.475) P15(-0.5,1.475) P16(0.5,1.475) P17(1.5,1.475) P18(2.5,1.475) P19(3.5,1.475) P20(4.5,1.475) P21(5.5,1.475) P22(6.5,1.475) P23(7.5,1.475) P24(8.5,1.475) P25(9.5,1.475) P26(10.5,1.475) P27(11.5,1.475) P28(12.5,1.475) P29(13.5,1.475) P30(14.5,1.475) R1(-14.5,0.475) R2(-13.5,0.475) R3(-12.5,0.475) R4(-11.5,0.475) R5(-10.5,0.475) R6(-9.5,0.475) R7(-8.5,0.475) R8(-7.5,0.475) R9(-6.5,0.475) R10(-5.5,0.475) R11(-4.5,0.475) R12(-3.5,0.475) R13(-2.5,0.475) R14(-1.5,0.475) R15(-0.5,0.475) R16(0.5,0.475) R17(1.5,0.475) R18(2.5,0.475) R19(3.5,0.475) R20(4.5,0.475) R21(5.5,0.475) R22(6.5,0.475) R23(7.5,0.475) R24(8.5,0.475) R25(9.5,0.475) R26(10.5,0.475) R27(11.5,0.475) R28(12.5,0.475) R29(13.5,0.475) R30(14.5,0.475) T1(-14.5,-0.525) T2(-13.5,-0.525) T3(-12.5,-0.525) T4(-11.5,-0.525) T5(-10.5,-0.525) T6(-9.5,-0.525) T7(-8.5,-0.525) T8(-7.5,-0.525) T9(-6.5,-0.525) T10(-5.5,-0.525) T11(-4.5,-0.525) T12(-3.5,-0.525) T13(-2.5,-0.525) T14(-1.5,-0.525) T15(-0.5,-0.525) T16(0.5,-0.525) T17(1.5,-0.525) T18(2.5,-0.525) T19(3.5,-0.525) T20(4.5,-0.525) T21(5.5,-0.525) T22(6.5,-0.525) T23(7.5,-0.525) T24(8.5,-0.525) T25(9.5,-0.525) T26(10.5,-0.525) T27(11.5,-0.525) T28(12.5,-0.525) T29(13.5,-0.525) T30(14.5,-0.525) U1(-14.5,-1.525) U2(-13.5,-1.525) U3(-12.5,-1.525) U4(-11.5,-1.525) U5(-10.5,-1.525) U6(-9.5,-1.525) U7(-8.5,-1.525) U8(-7.5,-1.525) U9(-6.5,-1.525) U10(-5.5,-1.525) U11(-4.5,-1.525) U12(-3.5,-1.525) U13(-2.5,-1.525) U14(-1.5,-1.525) U15(-0.5,-1.525) U16(0.5,-1.525) U17(1.5,-1.525) U18(2.5,-1.525) U19(3.5,-1.525) U20(4.5,-1.525) U21(5.5,-1.525) U22(6.5,-1.525) U23(7.5,-1.525) U24(8.5,-1.525) U25(9.5,-1.525) U26(10.5,-1.525) U27(11.5,-1.525) U28(12.5,-1.525) U29(13.5,-1.525) U30(14.5,-1.525) V1(-14.5,-2.525) V2(-13.5,-2.525) V3(-12.5,-2.525) V4(-11.5,-2.525) V5(-10.5,-2.525) V6(-9.5,-2.525) V7(-8.5,-2.525) V8(-7.5,-2.525) V9(-6.5,-2.525) V10(-5.5,-2.525) V11(-4.5,-2.525) V12(-3.5,-2.525) V13(-2.5,-2.525) V14(-1.5,-2.525) V15(-0.5,-2.525) V16(0.5,-2.525) V17(1.5,-2.525) V18(2.5,-2.525) V19(3.5,-2.525) V20(4.5,-2.525) V21(5.5,-2.525) V22(6.5,-2.525) V23(7.5,-2.525) V24(8.5,-2.525) V25(9.5,-2.525) V26(10.5,-2.525) V27(11.5,-2.525) V28(12.5,-2.525) V29(13.5,-2.525) V30(14.5,-2.525) W1(-14.5,-3.525) W2(-13.5,-3.525) W3(-12.5,-3.525) W4(-11.5,-3.525) W5(-10.5,-3.525) W6(-9.5,-3.525) W7(-8.5,-3.525) W8(-7.5,-3.525) W9(-6.5,-3.525) W10(-5.5,-3.525) W11(-4.5,-3.525) W12(-3.5,-3.525) W13(-2.5,-3.525) W14(-1.5,-3.525) W15(-0.5,-3.525) W16(0.5,-3.525) W17(1.5,-3.525) W18(2.5,-3.525) W19(3.5,-3.525) W20(4.5,-3.525) W21(5.5,-3.525) W22(6.5,-3.525) W23(7.5,-3.525) W24(8.5,-3.525) W25(9.5,-3.525) W26(10.5,-3.525) W27(11.5,-3.525) W28(12.5,-3.525) W29(13.5,-3.525) W30(14.5,-3.525) Y1(-14.5,-4.525) Y2(-13.5,-4.525) Y3(-12.5,-4.525) Y4(-11.5,-4.525) Y5(-10.5,-4.525) Y6(-9.5,-4.525) Y7(-8.5,-4.525) Y8(-7.5,-4.525) Y9(-6.5,-4.525) Y10(-5.5,-4.525) Y11(-4.5,-4.525) Y12(-3.5,-4.525) Y13(-2.5,-4.525) Y14(-1.5,-4.525) Y15(-0.5,-4.525) Y16(0.5,-4.525) Y17(1.5,-4.525) Y18(2.5,-4.525) Y19(3.5,-4.525) Y20(4.5,-4.525) Y21(5.5,-4.525) Y22(6.5,-4.525) Y23(7.5,-4.525) Y24(8.5,-4.525) Y25(9.5,-4.525) Y26(10.5,-4.525) Y27(11.5,-4.525) Y28(12.5,-4.525) Y29(13.5,-4.525) Y30(14.5,-4.525)
Top Overlay:
  circle w0.25: c-16.15,15.325 r0.125
  region: -14.5,15.475 -15.5,14.475 -15.5,15.475
  lines w0.2: -15.5,14.475 -14.5,15.475 ; -15.5,-15.525 15.5,-15.525 15.5,15.475 -15.5,15.475 -15.5,-15.525
Mechanical 13:
  lines w0.1: -15.5,-15.525 15.5,-15.525 15.5,15.475 -15.5,15.475 -15.5,-15.525
Mechanical 15:
  lines w0.05: -16,-16.025 16,-16.025 16,15.975 -16,15.975 -16,-16.025
  lines w0.1: -0.5,-0.025 0.5,-0.025 ; 0,-0.525 0,0.475
3D body "BGA900C100P30X30_3100X3100X254.step": height 2.54, standoff 0, extent -15.5,-15.5 15.5,15.5